# Altium footprint library cool_library.PcbLib: 1182 footprints (part 26 of 75)
Each footprint in its own frame and in the unit in brackets; x right, y up, seen from the top. Pads: shape width x height; smd on the part's side, far side on the other; paste and mask are expansions set on the pad; w line width, h text height; cw(c..) or ccw(c..) is an arc to the next point about the centre after c.
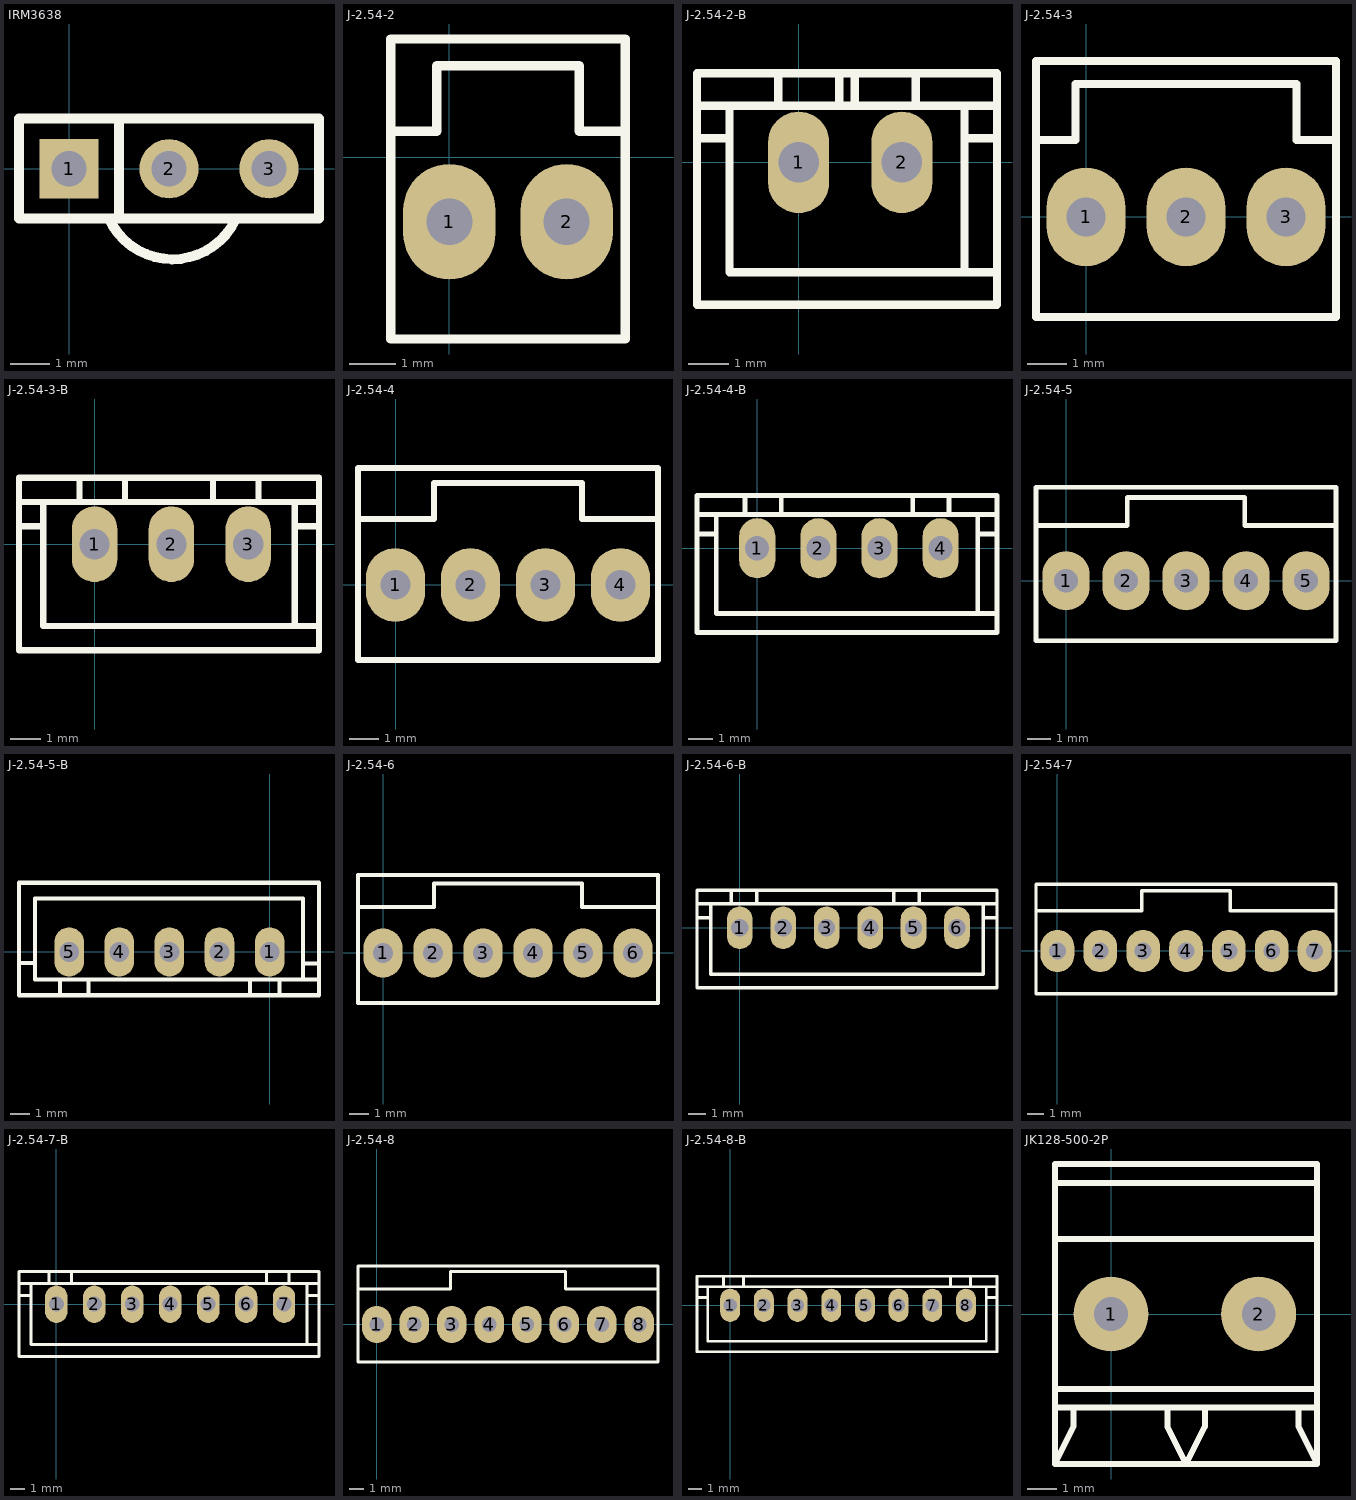
[diagram p25: the footprints below, top view; thin cyan lines are the x and y axes]

## IRM3638 [mm] "Infrared Interface"
pads (3):
  rect 1.5x1.5 hole 0.9: 1(0,0)
  round 1.5 hole 0.9: 2(2.54,0) 3(5.08,0)
Top Overlay:
  lines w0.254: 1.016,-1.27 ccw(c2.629,-0.521) 4.232,-1.29 ; 1.27,-1.27 1.27,1.27 ; -1.27,-1.27 6.35,-1.27 6.35,1.27 -1.27,1.27 -1.27,-1.27
3D body: height 0.25, standoff 0, extent -1.143,-1.27 6.35,1.27

## J-2.54-2 [mm]
pads (2):
  oval 2x2.5 hole 1: 1(0,-1.397) 2(2.54,-1.397)
Top Overlay:
  lines w0.203: -1.27,0.563 -0.27,0.563 -0.27,1.981 2.81,1.981 2.81,0.563 3.81,0.563 ; -1.27,-3.937 -1.27,2.563 3.81,2.563 3.81,-3.937 -1.27,-3.937

## J-2.54-2-B [mm]
pads (2):
  oval 1.5x2.5 hole 1: 1(0,0) 2(2.54,0)
Top Overlay:
  lines w0.203: -2.5,0.595 -1.7,0.595 ; -2.5,1.395 4.88,1.395 ; -1.7,1.395 -1.7,-2.705 4.88,-2.705 ; -0.5,1.395 -0.5,2.184 ; 1,1.42 1,2.184 ; 1.38,1.42 1.38,2.184 ; 2.88,1.395 2.88,2.184 ; 4.08,-2.705 4.08,1.395 ; 4.08,0.595 4.88,0.595 ; -2.5,-3.505 -2.5,2.195 4.88,2.195 4.88,-3.505 -2.5,-3.505

## J-2.54-3 [mm]
pads (3):
  oval 2x2.5 hole 1: 1(0,0) 2(2.54,0) 3(5.08,0)
Top Overlay:
  lines w0.203: -1.27,1.96 -0.27,1.96 -0.27,3.378 5.341,3.378 ; 5.35,3.378 5.35,1.96 6.35,1.96 ; 6.35,3.958 -1.27,3.96 -1.27,-2.54 6.35,-2.54 6.35,3.96

## J-2.54-3-B [mm]
pads (3):
  oval 1.5x2.5 hole 1: 1(0,0) 2(2.54,0) 3(5.08,0)
Top Overlay:
  lines w0.203: -2.5,0.595 -1.7,0.595 ; -2.5,1.395 7.42,1.395 ; -1.7,1.395 -1.7,-2.705 7.42,-2.705 ; -0.5,1.395 -0.5,2.184 ; 1,1.42 1,2.184 ; 3.92,1.42 3.92,2.184 ; 5.42,1.395 5.42,2.184 ; 6.62,-2.705 6.62,1.395 ; 6.62,0.595 7.42,0.595 ; -2.5,-3.505 7.42,-3.505 7.42,2.195 -2.5,2.195 -2.5,-3.505

## J-2.54-4 [mm]
pads (4):
  oval 2x2.5 hole 1: 1(0,0) 2(2.54,0) 3(5.08,0) 4(7.62,0)
Top Overlay:
  lines w0.203: -1.27,2.235 1.295,2.235 1.295,3.454 6.325,3.454 6.325,2.235 8.89,2.235 ; 8.89,3.955 -1.27,3.96 -1.27,-2.54 8.89,-2.54 8.89,3.96

## J-2.54-4-B [mm]
pads (4):
  oval 1.5x2.5 hole 1: 1(0,0) 2(2.54,0) 3(5.08,0) 4(7.62,0)
Top Overlay:
  lines w0.203: -2.5,0.595 -1.7,0.595 ; -2.5,1.395 9.96,1.395 ; -1.7,1.395 -1.7,-2.705 9.96,-2.705 ; -0.5,1.395 -0.5,2.184 ; 1,1.42 1,2.184 ; 6.46,1.42 6.46,2.184 ; 7.96,1.395 7.96,2.184 ; 9.16,-2.705 9.16,1.395 ; 9.16,0.595 9.96,0.595 ; -2.5,-3.505 -2.5,2.195 9.96,2.195 9.96,-3.505 -2.5,-3.505

## J-2.54-5 [mm]
pads (5):
  oval 2x2.5 hole 1: 1(0,0) 2(2.54,0) 3(5.08,0) 4(7.62,0) 5(10.16,0)
Top Overlay:
  lines w0.203: -1.27,2.337 2.591,2.337 2.591,3.531 7.569,3.531 7.569,2.337 11.43,2.337 ; -1.27,-2.54 -1.27,3.96 11.43,3.96 11.43,-2.54 -1.27,-2.54

## J-2.54-5-B [mm]
pads (5):
  oval 1.5x2.5 hole 1: 1(0,0) 2(-2.54,0) 3(-5.08,0) 4(-7.62,0) 5(-10.16,0)
Top Overlay:
  lines w0.203: -12.7,-2.195 2.5,-2.195 ; -12.7,-2.184 -12.7,3.505 2.5,3.505 ; -12.687,-0.559 -11.887,-0.559 ; -11.887,-1.397 -11.887,2.692 ; -11.887,-1.395 2.5,-1.395 ; -11.887,2.705 1.7,2.705 1.7,-1.395 ; -10.617,-2.187 -10.617,-1.397 ; -9.169,-2.161 -9.169,-1.397 ; -1,-2.184 -1,-1.42 ; 0.5,-2.184 0.5,-1.395 ; 1.7,-0.595 2.5,-0.595 ; 2.5,-2.195 2.5,3.505

## J-2.54-6 [mm]
pads (6):
  oval 2x2.5 hole 1: 1(0,0) 2(2.54,0) 3(5.08,0) 4(7.62,0) 5(10.16,0) 6(12.7,0)
Top Overlay:
  lines w0.203: -1.27,2.337 2.591,2.337 2.591,3.531 10.109,3.531 10.109,2.337 13.97,2.337 ; 13.97,3.958 -1.27,3.96 -1.27,-2.54 13.97,-2.54 13.97,3.96

## J-2.54-6-B [mm]
pads (6):
  oval 1.5x2.5 hole 1: 1(0,0) 2(2.54,0) 3(5.08,0) 4(7.62,0) 5(10.16,0) 6(12.7,0)
Top Overlay:
  lines w0.203: -2.5,0.595 -1.7,0.595 ; -2.5,1.395 15.04,1.395 ; -1.7,1.395 -1.7,-2.705 14.24,-2.705 14.24,1.395 ; -0.5,1.395 -0.5,2.184 ; 1,1.42 1,2.184 ; 9,1.42 9,2.184 ; 10.5,1.395 10.5,2.184 ; 14.24,0.595 15.04,0.595 ; -2.5,-3.505 15.04,-3.505 15.04,2.195 -2.5,2.195 -2.5,-3.505

## J-2.54-7 [mm]
pads (7):
  oval 2x2.5 hole 1: 1(0,0) 2(2.54,0) 3(5.08,0) 4(7.62,0) 5(10.16,0) 6(12.7,0) 7(15.24,0)
Top Overlay:
  lines w0.203: -1.27,2.388 5.004,2.388 5.004,3.581 10.236,3.581 10.236,2.388 16.51,2.388 ; -1.27,-2.54 16.51,-2.54 16.51,3.96 -1.27,3.96 -1.27,-2.54

## J-2.54-7-B [mm]
pads (7):
  oval 1.5x2.5 hole 1: 1(0,0) 2(2.54,0) 3(5.08,0) 4(7.62,0) 5(10.16,0) 6(12.7,0) 7(15.24,0)
Top Overlay:
  lines w0.203: -2.5,0.595 -1.7,0.595 ; -2.5,1.395 17.5,1.395 ; -1.7,1.395 -1.7,-2.705 17.5,-2.705 ; -0.5,1.395 -0.5,2.184 ; 1,1.42 1,2.184 ; 14.08,1.42 14.08,2.184 ; 15.58,1.395 15.58,2.184 ; 16.78,-2.705 16.78,1.395 ; 16.78,0.595 17.58,0.595 ; 17.5,-3.505 -2.5,-3.505 -2.5,2.195 17.5,2.195 ; 17.58,-3.505 17.58,2.195

## J-2.54-8 [mm]
pads (8):
  oval 2x2.5 hole 1: 1(0,0) 2(2.54,0) 3(5.08,0) 4(7.62,0) 5(10.16,0) 6(12.7,0) 7(15.24,0) 8(17.78,0)
Top Overlay:
  lines w0.203: -1.27,2.388 5.004,2.388 5.004,3.581 12.776,3.581 12.776,2.388 19.05,2.388 ; -1.27,-2.54 -1.27,3.96 19.05,3.96 19.05,-2.54 -1.27,-2.54

## J-2.54-8-B [mm]
pads (8):
  oval 1.5x2.5 hole 1: 1(0,0) 2(2.54,0) 3(5.08,0) 4(7.62,0) 5(10.16,0) 6(12.7,0) 7(15.24,0) 8(17.78,0)
Top Overlay:
  lines w0.203: -2.5,0.595 -1.7,0.595 ; -2.5,1.395 20.12,1.395 ; -1.7,1.395 -1.7,-2.705 19.32,-2.705 19.32,1.395 ; -0.5,1.395 -0.5,2.184 ; 1,1.42 1,2.184 ; 16.62,1.42 16.62,2.184 ; 18.12,1.395 18.12,2.184 ; 19.32,0.595 20.12,0.595 ; -2.5,-3.505 20.12,-3.505 20.12,2.195 -2.5,2.195 -2.5,-3.505

## JK128-500-2P [mil]
pads (2):
  round 100 hole 45: 1(0,0) 2(196.85,0)
Top Overlay:
  lines w8: -75,-125 275,-125 ; -75,-100 275,-100 ; -75,100 275,100 ; -75,175 275,175 ; -50,-125 -50,-150 -75,-200 ; 75,-125 75,-150 100,-200 125,-150 125,-125 ; 250,-125 250,-150 275,-200 ; -75,-200 -75,200 275,200 275,-200 ; -75,-200 275,-200